# Altium footprint library Connectors.PcbLib: 68 footprints (part 2 of 5)
Each footprint in its own frame and in the unit in brackets; x right, y up, seen from the top. Pads: shape width x height; smd on the part's side, far side on the other; paste and mask are expansions set on the pad; w line width, h text height; cw(c..) or ccw(c..) is an arc to the next point about the centre after c.
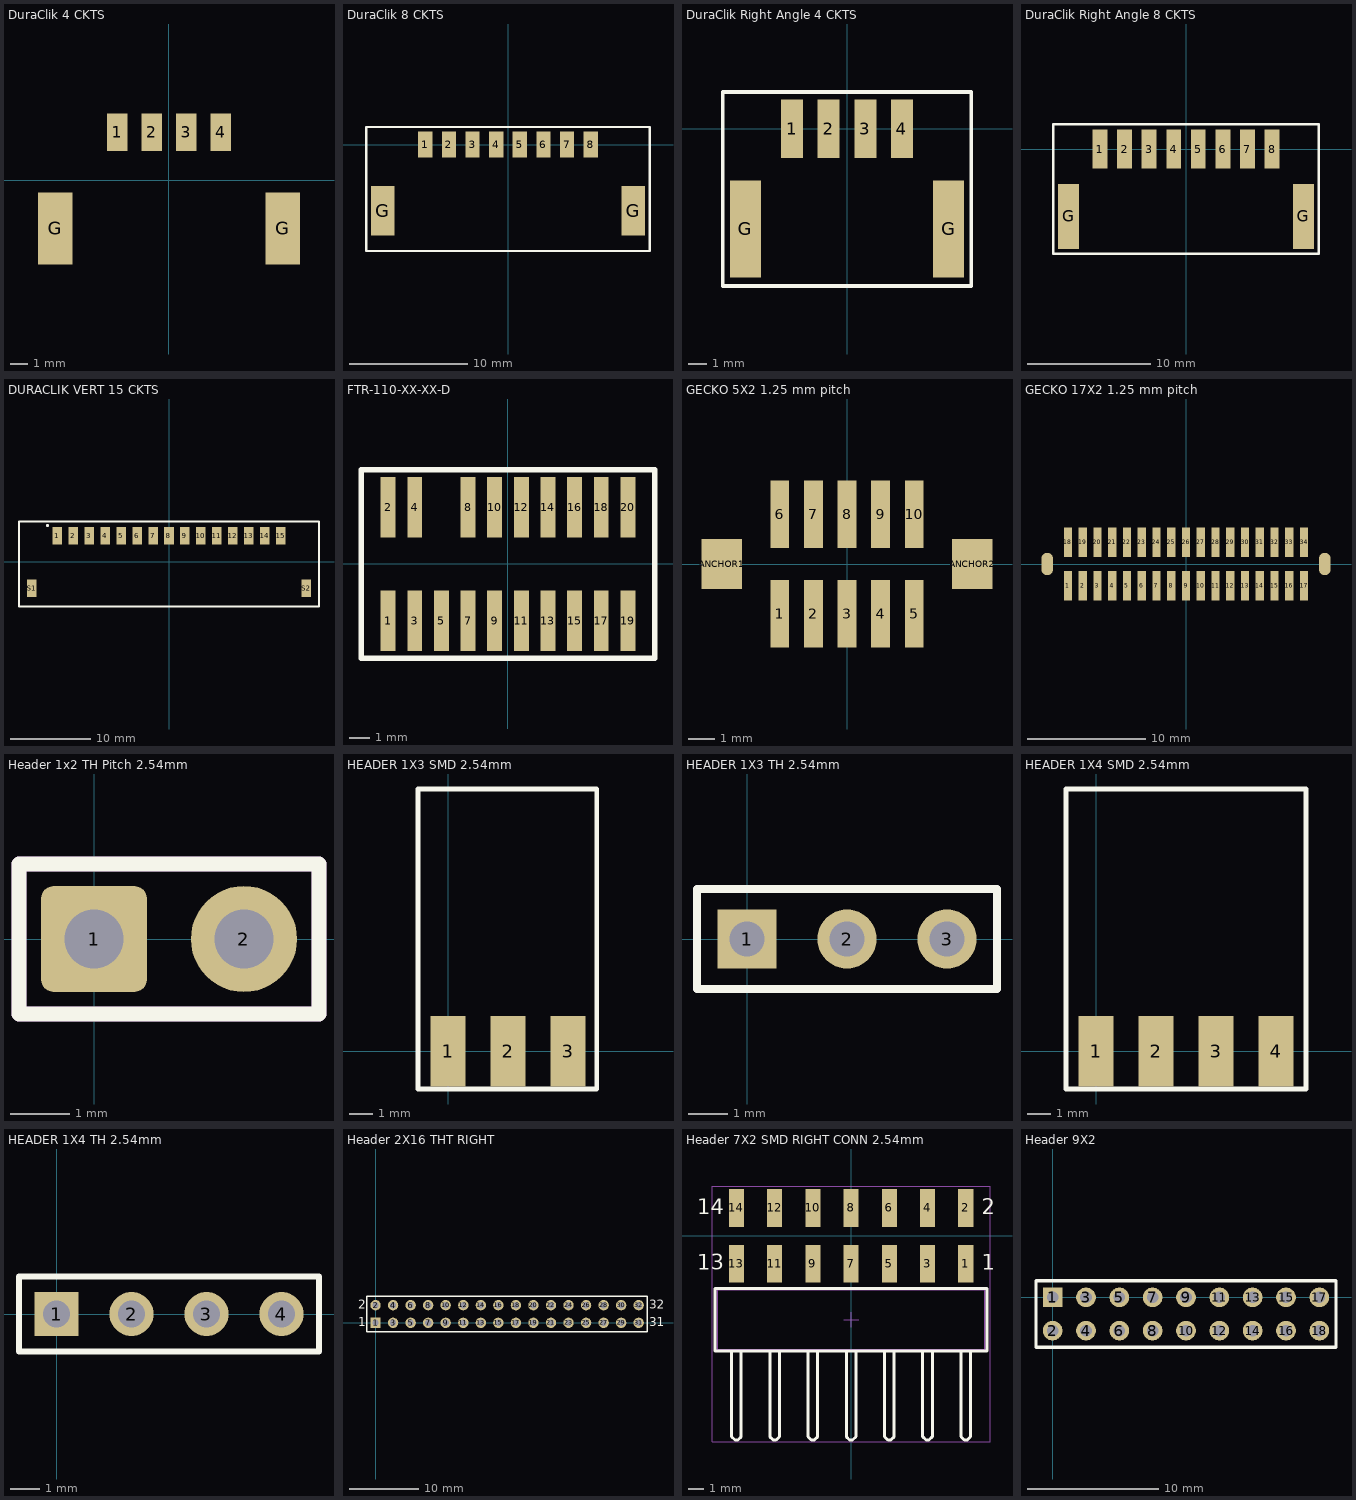
[diagram p1: the footprints below, top view; thin cyan lines are the x and y axes]

## DuraClik 4 CKTS [mm] "5600200420"
height 9.3
pads (6):
  rect 1.2x2.2 smd: 1(-3,2.79) 2(-1,2.79) 3(1,2.79) 4(3,2.79)
  rect 2x4.2 smd: G(-6.6,-2.79) G(6.6,-2.79)
3D body "5600200420.stp": height 8, standoff 0, extent -7.3,-5.79 7.3,3.36

## DuraClik 8 CKTS [mm] "5600200820"
height 9.3
pads (10):
  rect 1.2x2.2 smd: 1(-7,0) 2(-5,0) 3(-3,0) 4(-1,0) 5(1,0) 6(3,0) 7(5,0) 8(7,0)
  rect 2x4.2 smd: G(-10.6,-5.58) G(10.6,-5.58)
Top Overlay:
  lines w0.2: -12,-9 -12,1.5 12,1.5 12,-9 -12,-9
3D body "5600200820.stp": height 8, standoff 0, extent -11.3,-8.58 11.3,0.57

## DuraClik Right Angle 4 CKTS [mm] "502352-0400"
height 7
pads (6):
  rect 1.2x3.2 smd: 1(-3,0) 2(-1,0) 3(1,0) 4(3,0)
  rect 1.7x5.3 smd: G(-5.55,-5.48) G(5.55,-5.48)
Top Overlay:
  lines w0.2: -6.8,-8.6 6.8,-8.6 6.8,2 -6.8,2 -6.8,-8.6
3D body "5023520400.stp": height 6.36, standoff -0.04, extent -6,-8.25 6,1.15

## DuraClik Right Angle 8 CKTS [mm] "502352-0800"
height 7
pads (10):
  rect 1.2x3.2 smd: 1(-7,0) 2(-5,0) 3(-3,0) 4(-1,0) 5(1,0) 6(3,0) 7(5,0) 8(7,0)
  rect 1.7x5.3 smd: G(-9.55,-5.48) G(9.55,-5.48)
Top Overlay:
  lines w0.2: -10.8,-8.5 -10.8,2 10.8,2 10.8,-8.5 -10.8,-8.5
3D body "5023520800.stp": height 6.36, standoff -0.04, extent -10,-8.25 10,1.15

## DURACLIK VERT 15 CKTS [mm] "Connector Header Surface Mount 15 position 0.079\" (2.00mm)"
pads (17):
  rect 1.2x2.2 smd: 1(-14,3.29) 2(-12,3.29) 3(-10,3.29) 4(-8,3.29) 5(-6,3.29) 6(-4,3.29) 7(-2,3.29) 8(0,3.29) 9(2,3.29) 10(4,3.29) 11(6,3.29) 12(8,3.29) 13(10,3.29) 14(12,3.29) 15(14,3.29) S1(-17.2,-3.29) S2(17.2,-3.29)
Top Overlay:
  circle w0.2: c-15.24,4.572 r0.1
  lines w0.254: -18.796,-5.588 18.796,-5.588 18.796,5.08 -18.796,5.08 -18.796,-5.588
3D body "5600201530.stp": height 8, standoff 0, extent -18.3,-5.045 18.3,4.105

## FTR-110-XX-XX-D [mm]
pads (19):
  rect 0.711x2.87 smd: 1(-5.715,-2.705) 2(-5.715,2.705) 3(-4.445,-2.705) 4(-4.445,2.705) 5(-3.175,-2.705) 7(-1.905,-2.705) 8(-1.905,2.705) 9(-0.635,-2.705) 10(-0.635,2.705) 11(0.635,-2.705) 12(0.635,2.705) 13(1.905,-2.705) 14(1.905,2.705) 15(3.175,-2.705) 16(3.175,2.705) 17(4.445,-2.705) 18(4.445,2.705) 19(5.715,-2.705) 20(5.715,2.705)
Top Overlay:
  lines w0.254: -7,-4.5 -7,4.5 7,4.5 7,-4.5 -7,-4.5
3D body "FTR-110-03-S-D-06.stp": height 6.98, standoff 0, extent -6.35,-3.759 6.35,3.759

## GECKO 5X2 1.25 mm pitch [mm] "5+5 Pos. Male DIL Vertical SMT Conn. Latches (T+R)"
height 6.88
pads (12):
  rect 0.7x2.5 smd: 1(-2.5,-1.85) 2(-1.25,-1.85) 3(0,-1.85) 4(1.25,-1.85) 5(2.5,-1.85) 6(-2.5,1.85) 7(-1.25,1.85) 8(0,1.85) 9(1.25,1.85) 10(2.5,1.85)
  rect 1.5x1.85 smd: ANCHOR1(-4.65,0) ANCHOR2(4.65,0)
3D body "g125-ms11005l3_asm.stp": height 6.9, standoff -0.02, extent -5.19,-2.901 5.19,2.9

## GECKO 17X2 1.25 mm pitch [mm] "17+17 Pos. Male DIL Vertical SMT Conn. Latches (T+R)"
height 6.88
pads (36):
  rect 0.7x2.5 smd: 1(-10,-1.85) 2(-8.75,-1.85) 3(-7.5,-1.85) 4(-6.25,-1.85) 5(-5,-1.85) 6(-3.75,-1.85) 7(-2.5,-1.85) 8(-1.25,-1.85) 9(0,-1.85) 10(1.25,-1.85) 11(2.5,-1.85) 12(3.75,-1.85) 13(5,-1.85) 14(6.25,-1.85) 15(7.5,-1.85) 16(8.75,-1.85) 17(10,-1.85) 18(-10,1.85) 19(-8.75,1.85) 20(-7.5,1.85) 21(-6.25,1.85) 22(-5,1.85) 23(-3.75,1.85) 24(-2.5,1.85) 25(-1.25,1.85) 26(0,1.85) 27(1.25,1.85) 28(2.5,1.85) 29(3.75,1.85) 30(5,1.85) 31(6.25,1.85) 32(7.5,1.85) 33(8.75,1.85) 34(10,1.85)
  oval 1x1.9 smd: ANCHOR1(-11.75,0) ANCHOR2(11.75,0)
3D body "g125-ms13405l3_asm.stp": height 6.9, standoff -0.02, extent -12.69,-2.9 12.69,2.901

## Header 1x2 TH Pitch 2.54mm [mm] "PinHeader 1x2 TH Pitch 2.54mm"
height 9.5
pads (2):
  rrect25% 1.8x1.8 hole 1: 1(0,0)
  round 1.8 hole 1: 2(2.54,0)
Top Overlay:
  lines w0.254: 1.27,1.27 -1.27,1.27 ; -1.27,1.27 -1.27,-1.27 3.81,-1.27 3.81,1.27 -1.27,1.27
Top Assy Drawing:
  lines w0.254: 1.27,1.27 -1.27,1.27 ; -1.27,1.27 -1.27,-1.27 3.81,-1.27 3.81,1.27 -1.27,1.27
3D body "Pin Header 1x2 TH Pitch 2.54mm.stp": height 9.5, standoff -3.2, extent -1.27,-1.27 3.81,1.27

## HEADER 1X3 SMD 2.54mm [mm] "Connector; Header; 3 Position"
pads (3):
  rect 1.5x3 smd: 1(0,0) 2(2.54,0) 3(5.08,0)
Top Overlay:
  lines w0.2: -1.27,-1.6 -1.27,11.1 6.3,11.1 6.3,-1.6 -1.27,-1.6
3D body "DS1025 (PLS-03T CONNFLY).stp": height 2.54, standoff 0, extent -1.27,-1.05 6.35,11.05

## HEADER 1X3 TH 2.54mm [mm] "Connector; Header; 3 Position"
pads (3):
  rect 1.5x1.5 hole 0.9: 1(0,0)
  round 1.5 hole 0.9: 2(2.54,0) 3(5.08,0)
Top Overlay:
  lines w0.2: -1.27,-1.27 6.35,-1.27 6.35,1.27 -1.27,1.27 -1.27,-1.27
3D body "Pin Header 1x3 TH Pitch 2.54mm.stp": height 9.5, standoff -3.2, extent -1.27,-1.27 6.35,1.27

## HEADER 1X4 SMD 2.54mm [mm] "Connector; Header; 4 Position"
pads (4):
  rect 1.5x3 smd: 1(0,0) 2(2.54,0) 3(5.08,0) 4(7.62,0)
Top Overlay:
  lines w0.2: -1.27,-1.6 8.89,-1.6 8.89,11.1 -1.27,11.1 -1.27,-1.6
3D body "DS1025 (PLS-04T CONNFLY).stp": height 2.54, standoff 0, extent -1.27,-1.05 8.89,11.05

## HEADER 1X4 TH 2.54mm [mm] "Connector; Header; 4 Position"
pads (4):
  rect 1.5x1.5 hole 0.9: 1(0,0)
  round 1.5 hole 0.9: 2(2.54,0) 3(5.08,0) 4(7.62,0)
Top Overlay:
  lines w0.2: -1.27,-1.27 -1.27,1.27 8.89,1.27 8.89,-1.27 -1.27,-1.27
3D body "Pin Header 1x4 TH Pitch 2.54mm.stp": height 9.5, standoff -3.2, extent -1.27,-1.27 8.89,1.27

## Header 2X16 THT RIGHT [mm] "Connector; Header; 16x2 Position"
pads (32):
  rect 1.5x1.5 hole 0.9: 1(0,0)
  round 1.5 hole 0.9: 2(0,2.54) 3(2.54,0) 4(2.54,2.54) 5(5.08,0) 6(5.08,2.54) 7(7.62,0) 8(7.62,2.54) 9(10.16,0) 10(10.16,2.54) 11(12.7,0) 12(12.7,2.54) 13(15.24,0) 14(15.24,2.54) 15(17.78,0) 16(17.78,2.54) 17(20.32,0) 18(20.32,2.54) 19(22.86,0) 20(22.86,2.54) 21(25.4,0) 22(25.4,2.54) 23(27.94,0) 24(27.94,2.54) 25(30.48,0) 26(30.48,2.54) 27(33.02,0) 28(33.02,2.54) 29(35.56,0) 30(35.56,2.54) 31(38.1,0) 32(38.1,2.54)
Top Overlay:
  lines w0.2: -1.27,-1.27 39.37,-1.27 39.37,3.81 -1.27,3.81 -1.27,-1.27
  text "2" at -2.54,2.032 h1.27
  text "1" at -2.54,-0.508 h1.27
  text "31" at 39.624,-0.508 h1.27
  text "32" at 39.624,2.032 h1.27
3D body "Header 16 x 2 RA - PH2RA-32-UA v1.step": height 5.01, standoff -2.99, extent -1.27,-0.32 39.37,12.44

## Header 7X2 SMD RIGHT CONN 2.54mm [mm] "Connector Header Surface Mount, Right Angle 14 position 0.100\" (2.54mm)"
pads (14):
  rect 1x2.5 smd: 1(7.62,-1.85) 2(7.62,1.85) 3(5.08,-1.85) 4(5.08,1.85) 5(2.54,-1.85) 6(2.54,1.85) 7(0,-1.85) 8(0,1.85) 9(-2.54,-1.85) 10(-2.54,1.85) 11(-5.08,-1.85) 12(-5.08,1.85) 13(-7.62,-1.85) 14(-7.62,1.85)
Top Overlay:
  lines w0.2: -7.94,-7.645 -7.94,-12.945 -7.94,-13.225 -7.94,-13.35 -7.72,-13.57 -7.52,-13.57 -7.3,-13.35 -7.3,-13.225 -7.3,-12.945 -7.3,-7.645 ; -5.4,-7.645 -5.4,-12.945 -5.4,-13.225 -5.4,-13.35 -5.18,-13.57 -4.98,-13.57 -4.76,-13.35 -4.76,-13.225 -4.76,-12.945 -4.76,-7.645 ; -2.86,-7.645 -2.86,-12.945 -2.86,-13.225 -2.86,-13.35 -2.64,-13.57 -2.44,-13.57 -2.22,-13.35 -2.22,-13.225 -2.22,-12.945 -2.22,-7.645 ; -0.32,-7.645 -0.32,-12.945 -0.32,-13.225 -0.32,-13.35 -0.1,-13.57 0.1,-13.57 0.32,-13.35 0.32,-13.225 0.32,-12.945 0.32,-7.645 ; 2.22,-7.645 2.22,-12.945 2.22,-13.225 2.22,-13.35 2.44,-13.57 2.64,-13.57 2.86,-13.35 2.86,-13.225 2.86,-12.945 2.86,-7.645 ; 4.76,-7.645 4.76,-12.945 4.76,-13.225 4.76,-13.35 4.98,-13.57 5.18,-13.57 5.4,-13.35 5.4,-13.225 5.4,-12.945 5.4,-7.645 ; 7.3,-7.645 7.3,-12.945 7.3,-13.225 7.3,-13.35 7.52,-13.57 7.72,-13.57 7.94,-13.35 7.94,-13.225 7.94,-12.945 7.94,-7.645 ; -9.04,-7.645 -9.04,-3.495 9.04,-3.495 9.04,-7.645 -9.04,-7.645
  text "14" at -10.24,1.43 h1.02
  text "2" at 8.68,1.43 h1.02
  text "13" at -10.24,-2.27 h1.02
  text "1" at 8.68,-2.27 h1.02
3D Bodies:
  lines w0.1: -7.94,-7.57 -7.94,-12.945 -7.94,-13.225 -7.94,-13.35 -7.72,-13.57 -7.52,-13.57 -7.3,-13.35 -7.3,-13.225 -7.3,-12.945 -7.3,-7.57 ; -5.4,-7.57 -5.4,-12.945 -5.4,-13.225 -5.4,-13.35 -5.18,-13.57 -4.98,-13.57 -4.76,-13.35 -4.76,-13.225 -4.76,-12.945 -4.76,-7.57 ; -2.86,-7.57 -2.86,-12.945 -2.86,-13.225 -2.86,-13.35 -2.64,-13.57 -2.44,-13.57 -2.22,-13.35 -2.22,-13.225 -2.22,-12.945 -2.22,-7.57 ; -0.32,-7.57 -0.32,-12.945 -0.32,-13.225 -0.32,-13.35 -0.1,-13.57 0.1,-13.57 0.32,-13.35 0.32,-13.225 0.32,-12.945 0.32,-7.57 ; 2.22,-7.57 2.22,-12.945 2.22,-13.225 2.22,-13.35 2.44,-13.57 2.64,-13.57 2.86,-13.35 2.86,-13.225 2.86,-12.945 2.86,-7.57 ; 4.76,-7.57 4.76,-12.945 4.76,-13.225 4.76,-13.35 4.98,-13.57 5.18,-13.57 5.4,-13.35 5.4,-13.225 5.4,-12.945 5.4,-7.57 ; 7.3,-7.57 7.3,-12.945 7.3,-13.225 7.3,-13.35 7.52,-13.57 7.72,-13.57 7.94,-13.35 7.94,-13.225 7.94,-12.945 7.94,-7.57 ; -8.89,-7.57 8.89,-7.57 8.89,-3.57 -8.89,-3.57 -8.89,-7.57
Component Info:
  lines w0.05: -0.5,-5.57 0.5,-5.57 ; 0,-6.07 0,-5.07 ; -9.24,-13.695 -9.24,3.3 9.24,3.3 9.24,-13.695 -9.24,-13.695
3D body "610114249121.stp": height -0.56, standoff -7.04, extent -8.89,-13.575 8.89,2.585

## Header 9X2 [mm]
pads (18):
  rect 1.5x1.5 hole 0.9: 1(0,0)
  round 1.5 hole 0.9: 2(0,-2.54) 3(2.54,0) 4(2.54,-2.54) 5(5.08,0) 6(5.08,-2.54) 7(7.62,0) 8(7.62,-2.54) 9(10.16,0) 10(10.16,-2.54) 11(12.7,0) 12(12.7,-2.54) 13(15.24,0) 14(15.24,-2.54) 15(17.78,0) 16(17.78,-2.54) 17(20.32,0) 18(20.32,-2.54)
Top Overlay:
  lines w0.254: -1.27,-3.81 21.59,-3.81 21.59,1.27 -1.27,1.27 -1.27,-3.81
3D body "Pin Header 1x9 TH Pitch 2.54mm.stp": height 9.5, standoff -3.2, extent -1.27,-3.81 21.59,-1.27
3D body "Pin Header 1x9 TH Pitch 2.54mm.stp": height 9.5, standoff -3.2, extent -1.27,-1.27 21.59,1.27